# Altium footprint library Inductors.PcbLib: 70 footprints (part 3 of 5)
Each footprint in its own frame and in the unit in brackets; x right, y up, seen from the top. Pads: shape width x height; smd on the part's side, far side on the other; paste and mask are expansions set on the pad; w line width, h text height; cw(c..) or ccw(c..) is an arc to the next point about the centre after c.
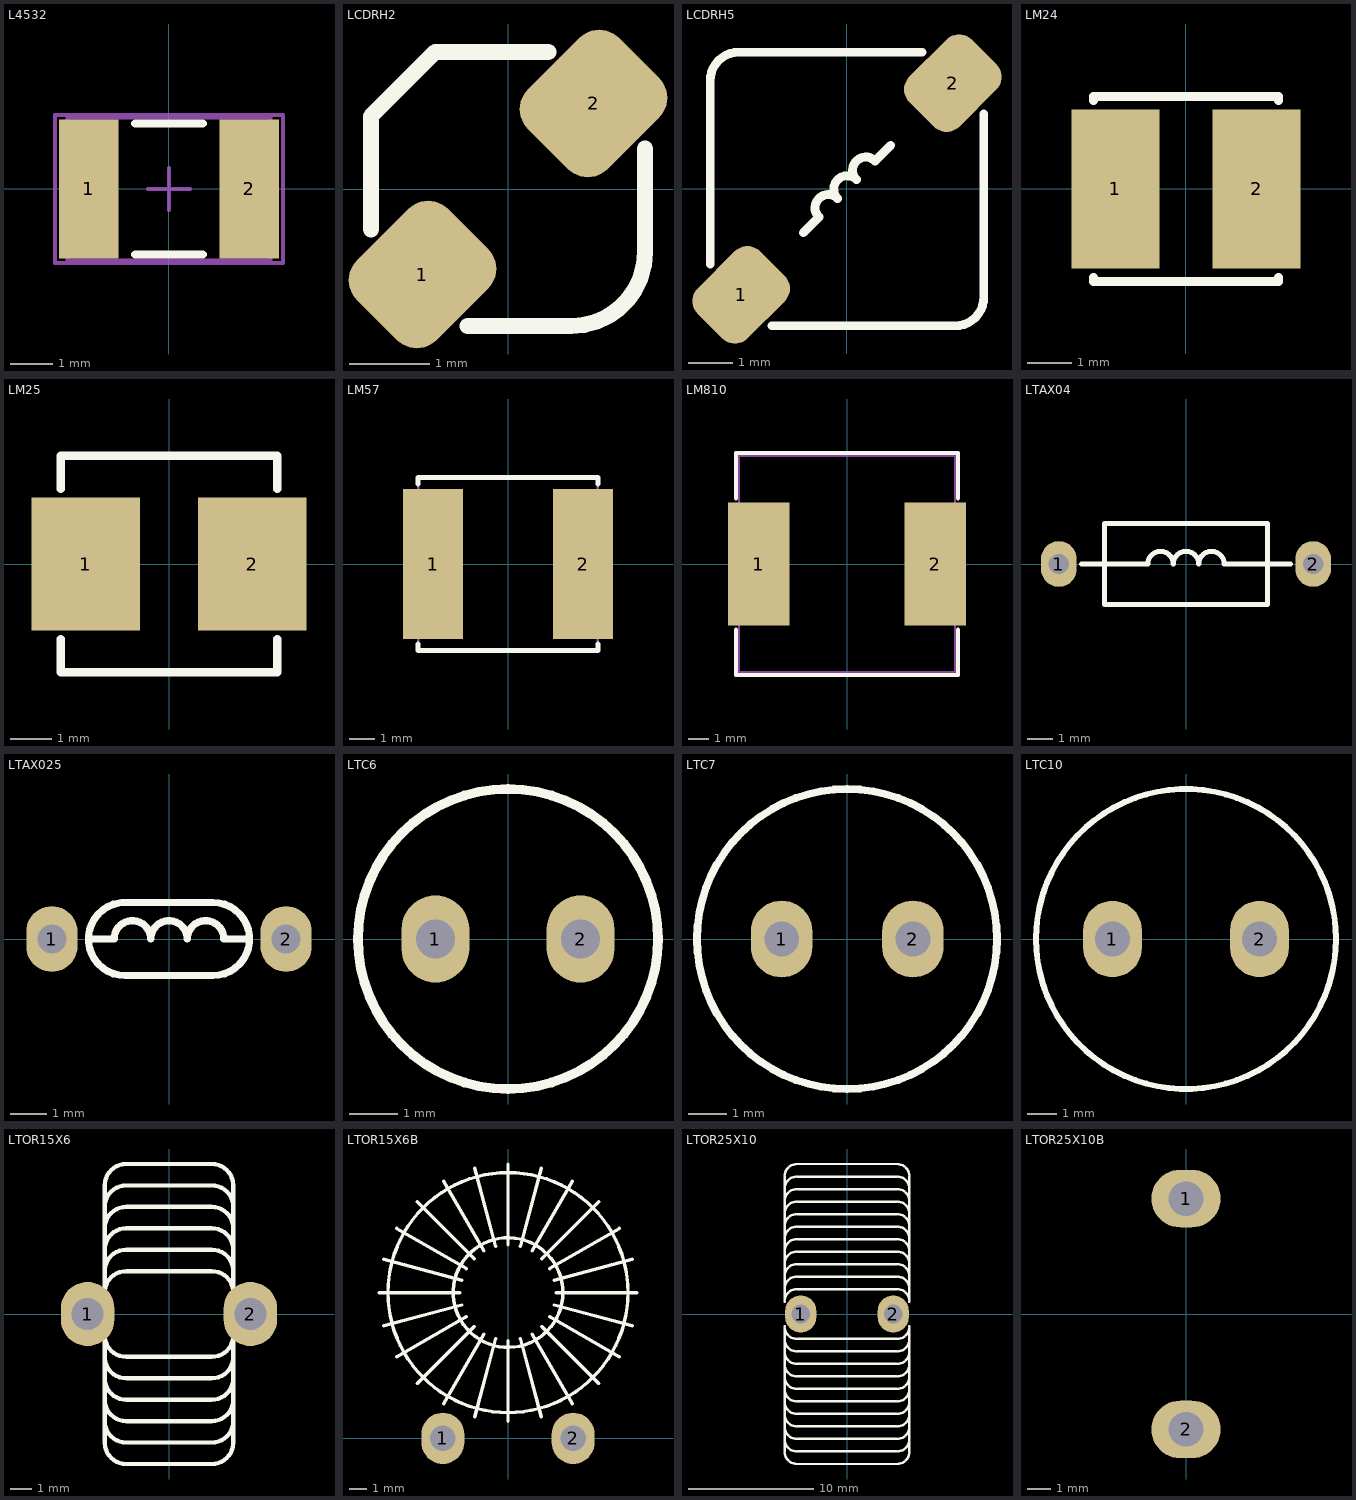
[diagram p2: the footprints below, top view; thin cyan lines are the x and y axes]

## L4532 [mm] "4532, 4.5*3.2mm"
height 0.55
pads (2):
  rect 1.4x3.3 smd: 1(-1.9,0) 2(1.9,0)
Top Overlay:
  lines w0.2: -0.8,-1.55 0.8,-1.55 ; -0.8,1.55 0.8,1.55
Mechanical 13:
  lines w0.1: -2.4,-1.7 -2.4,1.7 2.4,1.7 2.4,-1.7 -2.4,-1.7
Mechanical 15:
  lines w0.1: -0.5,0 0.5,0 ; 0,-0.5 0,0.5 ; -2.7,-1.75 -2.7,1.75 2.7,1.75 2.7,-1.75 -2.7,-1.75
3D body "INDC4532X175N.STEP": height 1.75, standoff 0, extent -2.25,-1.6 2.25,1.6

## LCDRH2 [mm] "3.2*3.2*2.0mm"
pads (2):
  rrect50% 1.4x1.6 smd rot 135: 1(-1.061,-1.061) 2(1.061,1.061)
Top Overlay:
  lines w0.2: -1.7,-0.5 -1.7,0.9 -0.9,1.7 0.5,1.7 ; -0.5,-1.7 0.784,-1.7 ccw(c0.784,-0.784) 1.7,-0.784 1.7,0.5
3D body "User Library-CDRH2D18-1.step": height 2.05, standoff 0, extent -1.6,-1.6 1.6,1.6

## LCDRH5 [mm] "6*6*2mm"
height 1.8
pads (2):
  rrect50% 1.6x2 smd rot 135 mask+0.1: 1(-2.4,-2.4) 2(2.4,2.4)
Top Overlay:
  lines w0.2: -3.1,-1.7 -3.1,2.455 cw(c-2.455,2.455) -2.455,3.1 1.7,3.1 ; -1.7,-3.1 2.455,-3.1 ccw(c2.455,-2.455) 3.1,-2.455 3.1,1.7 ; -0.99,-0.99 -0.636,-0.636 cw(c-0.424,-0.424) -0.212,-0.212 cw(c0,0) 0.212,0.212 cw(c0.424,0.424) 0.636,0.636 0.99,0.99
3D body "User Library-CDRH5D18.STEP": height 2, standoff 0, extent -3,-3 3,3.005

## LM24 [mm] "2*2 to 4*4mm"
height 2.5
pads (2):
  rect 2x3.6 smd: 1(-1.6,0) 2(1.6,0)
Top Overlay:
  lines w0.2: -2.1,-2 -2.1,-2.1 2.1,-2.1 2.1,-2 ; -2.1,2 -2.1,2.1 2.1,2.1 2.1,2
3D body: height 3, standoff 0, extent -2,-2 2,2

## LM25 [mm] "2*2 to 5*5mm"
pads (2):
  rect 2.6x3.2 smd: 1(-2,0) 2(2,0)
Top Overlay:
  lines w0.2: -2.6,-1.8 -2.6,-2.6 2.6,-2.6 2.6,-1.8 ; -2.6,1.8 -2.6,2.6 2.6,2.6 2.6,1.8
3D body: height 3, standoff 0, extent -2.5,-2.5 2.5,2.5

## LM57 [mm] "5*5 to 7*7"
height 4.5
pads (2):
  rect 2.4x6 smd: 1(-3,0) 2(3,0)
Top Overlay:
  lines w0.2: -3.6,-3.2 -3.6,-3.45 3.6,-3.45 3.6,-3.2 ; -3.6,3.2 -3.6,3.45 3.6,3.45 3.6,3.2
Mechanical 13:
  lines w0.1: -3.6,-3.45 3.6,-3.45 3.6,3.45 -3.6,3.45 -3.6,-3.45
3D body "User Library-FP3-Cooper.step": height 3, standoff 0, extent -3.625,-3.35 3.625,3.35

## LM810 [mm] "8*8 to 10*10"
height 4
pads (2):
  rect 3x6 smd: 1(-4.3,0) 2(4.3,0)
Top Overlay:
  lines w0.2: -5.4,-3.2 -5.4,-5.4 5.4,-5.4 5.4,-3.2 ; -5.4,3.2 -5.4,5.4 5.4,5.4 5.4,3.2
Mechanical 13:
  lines w0.1: -5.25,-5.25 -5.25,5.25 5.25,5.25 5.25,-5.25 -5.25,-5.25
3D body "User Library-10x10 SMT Power Inductor.step": height 4.8, standoff 0, extent -5.2,-5.2 5.2,5.2

## LTAX04 [mm] "Axial, 9.8mm"
pads (2):
  oval 1.4x1.8 hole 0.8: 1(-5,0) 2(5,0)
Top Overlay:
  lines w0.2: -4.1,0 -1.5,0 cw(c-1,0) -0.5,0 cw(c0,0) 0.5,0 cw(c1,0) 1.5,0 4.1,0 ; -3.2,-1.6 -3.2,1.6 3.2,1.6 3.2,-1.6 -3.2,-1.6
3D body "RES 0.25W.STEP": height 2.68, standoff -2.11, extent -5.15,-1.568 5.15,1.567

## LTAX025 [mm] "Axial, 6.4mm"
pads (2):
  oval 1.4x1.8 hole 0.8 mask+0.1: 1(-3.2,0) 2(3.2,0)
Top Overlay:
  lines w0.2: -2.2,0 -1.5,0 cw(c-1,0) -0.5,0 cw(c0,0) 0.5,0 cw(c1,0) 1.5,0 2.2,0 ; -1.3,1 1.2,1 cw(c1.2,0) 1.2,-1 -1.2,-1 cw(c-1.2,0) -1.2,1
3D body "Inductor.STEP": height 1.92, standoff -2, extent -3.429,-0.914 3.429,0.914

## LTC6 [mm] "6mm"
pads (2):
  oval 1.4x1.8 hole 0.8 mask+0.1: 1(-1.5,0) 2(1.5,0)
Top Overlay:
  circle w0.2: c0,0 r3.1
3D body "User Library-L6-8-3.STEP": height 8, standoff -3.7, extent -3,-3 3,3

## LTC7 [mm] "7.5mm"
pads (2):
  oval 1.6x2 hole 0.9 mask+0.1: 1(-1.7,0) 2(1.714,0)
Top Overlay:
  circle w0.2: c0,0 r3.9
3D body "Coilcraft-DR0608-DEFAULT.STEP": height 10.7, standoff -3.8, extent -3.75,-3.75 3.75,3.75

## LTC10 [mm] "10mm"
pads (2):
  oval 2x2.6 hole 1.2: 1(-2.5,0) 2(2.5,0)
Top Overlay:
  circle w0.2: c0,0 r5.1
3D body "User Library-Inductor 10x12 (200 mils).STEP": height 12.13, standoff -3.87, extent -5,-4.988 5,4.988

## LTOR15X6 [mm] "15.0*6.0mm"
pads (2):
  oval 2.5x3 hole 1.5: 1(-3.8,0) 2(3.8,0)
Top Overlay:
  lines w0.2: -3,-5 ccw(c-2,-5) -2,-6 2,-6 ccw(c2,-5) 3,-5 ; -3,-4 ccw(c-2,-4) -2,-5 2,-5 ccw(c2,-4) 3,-4 ; -3,-3 ccw(c-2,-3) -2,-4 2,-4 ccw(c2,-3) 3,-3 ; -3,-2 ccw(c-2,-2) -2,-3 2,-3 ccw(c2,-2) 3,-2 ; -3,-1.3 -3,-6 ccw(c-2,-6) -2,-7 2,-7 ccw(c2,-6) 3,-6 3,-1.3 ; -3,-1 ccw(c-2,-1) -2,-2 2,-2 ccw(c2,-1) 3,-1 ; -3,1 cw(c-2,1) -2,2 2,2 cw(c2,1) 3,1 ; -3,1.3 -3,6 cw(c-2,6) -2,7 2,7 cw(c2,6) 3,6 3,1.3 ; -3,2 cw(c-2,2) -2,3 2,3 cw(c2,2) 3,2 ; -3,3 cw(c-2,3) -2,4 2,4 cw(c2,3) 3,3 ; -3,4 cw(c-2,4) -2,5 2,5 cw(c2,4) 3,4 ; -3,5 cw(c-2,5) -2,6 2,6 cw(c2,5) 3,5
3D body "Inductor1_70_2.step": height 13.85, standoff -5.5, extent -3.85,-6.847 3.85,6.847

## LTOR15X6B [mm] "15.0*6.0mm"
pads (2):
  oval 2.5x3 hole 1.5: 1(-3.8,0) 2(3.8,0)
Top Overlay:
  circle w0.2: c0,8.5 r7
  circle w0.2: c0.004,8.5 r3.2
  lines w0.2: -7.5,8.5 -2.8,8.5 ; -7.244,6.559 -2.705,7.775 ; -7.244,10.441 -2.705,9.225 ; -6.495,4.75 -2.425,7.1 ; -6.495,12.25 -2.425,9.9 ; -5.303,3.197 -1.98,6.52 ; -5.303,13.803 -1.98,10.48 ; -3.75,2.005 -1.4,6.075 ; -3.75,14.995 -1.4,10.925 ; -1.941,1.256 -0.725,5.795 ; -1.941,15.744 -0.725,11.205 ; 0,1 0,5.7 ; 0,11.3 0,16 ; 0.725,5.795 1.941,1.256 ; 0.725,11.205 1.941,15.744 ; 1.4,6.075 3.75,2.005 ; 1.4,10.925 3.75,14.995 ; 1.98,6.52 5.303,3.197 ; 1.98,10.48 5.303,13.803 ; 2.425,7.1 6.495,4.75 ; 2.425,9.9 6.495,12.25 ; 2.705,7.775 7.244,6.559 ; 2.705,9.225 7.244,10.441 ; 2.8,8.5 7.5,8.5
3D body "Inductor1_70_2.step": height 7.65, standoff -0.05, extent -6.847,-3.9 6.847,15.446

## LTOR25X10 [mm] "25.0*10.0mm"
pads (2):
  oval 2.5x3 hole 1.5: 1(-3.7,0) 2(3.7,0)
Top Overlay:
  lines w0.2: -5,-10 ccw(c-4,-10) -4,-11 4,-11 ccw(c4,-10) 5,-10 ; -5,-9 ccw(c-4,-9) -4,-10 4,-10 ccw(c4,-9) 5,-9 ; -5,-8 ccw(c-4,-8) -4,-9 4,-9 ccw(c4,-8) 5,-8 ; -5,-7 ccw(c-4,-7) -4,-8 4,-8 ccw(c4,-7) 5,-7 ; -5,-6 ccw(c-4,-6) -4,-7 4,-7 ccw(c4,-6) 5,-6 ; -5,-5 ccw(c-4,-5) -4,-6 4,-6 ccw(c4,-5) 5,-5 ; -5,-4 ccw(c-4,-4) -4,-5 4,-5 ccw(c4,-4) 5,-4 ; -5,-3 ccw(c-4,-3) -4,-4 4,-4 ccw(c4,-3) 5,-3 ; -5,-2 ccw(c-4,-2) -4,-3 4,-3 ccw(c4,-2) 5,-2 ; -5,-1.3 -5,-11 ccw(c-4,-11) -4,-12 4,-12 ccw(c4,-11) 5,-11 5,-1.3 ; -5,-1 ccw(c-4,-1) -4,-2 4,-2 ccw(c4,-1) 5,-1 ; -5,1 cw(c-4,1) -4,2 4,2 cw(c4,1) 5,1 ; -5,1.3 -5,11 cw(c-4,11) -4,12 4,12 cw(c4,11) 5,11 5,1.3 ; -5,2 cw(c-4,2) -4,3 4,3 cw(c4,2) 5,2 ; -5,3 cw(c-4,3) -4,4 4,4 cw(c4,3) 5,3 ; -5,4 cw(c-4,4) -4,5 4,5 cw(c4,4) 5,4 ; -5,5 cw(c-4,5) -4,6 4,6 cw(c4,5) 5,5 ; -5,6 cw(c-4,6) -4,7 4,7 cw(c4,6) 5,6 ; -5,7 cw(c-4,7) -4,8 4,8 cw(c4,7) 5,7 ; -5,8 cw(c-4,8) -4,9 4,9 cw(c4,8) 5,8 ; -5,9 cw(c-4,9) -4,10 4,10 cw(c4,9) 5,9 ; -5,10 cw(c-4,10) -4,11 4,11 cw(c4,10) 5,10
3D body "User Library-5701-RC.STEP": height 23.03, standoff -12, extent -5.62,-11.21 5.7,11.21

## LTOR25X10B [mm] "25.0*10.0mm"
pads (2):
  oval 3x2.5 hole 1.5: 1(0,5) 2(0,-5)
3D body "User Library-5701-RC.STEP": height 11.26, standoff -0.06, extent -11.21,-16.4 11.21,18.635